# Altium footprint library Raspberry pi.PcbLib: 3 footprints
Each footprint in its own frame and in the unit in brackets; x right, y up, seen from the top. Pads: shape width x height; smd on the part's side, far side on the other; paste and mask are expansions set on the pad; w line width, h text height; cw(c..) or ccw(c..) is an arc to the next point about the centre after c.
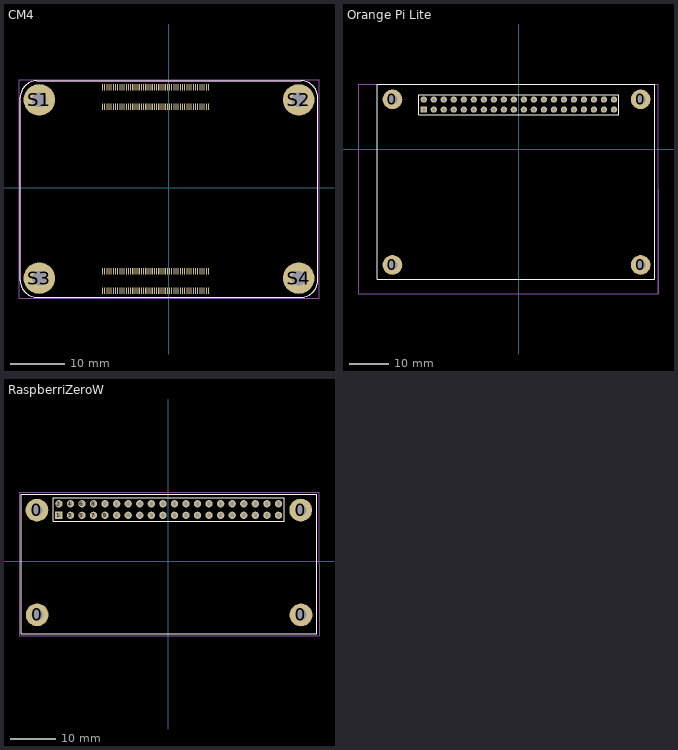
[diagram p0: the footprints below, top view; thin cyan lines are the x and y axes]

## CM4 [mm]
pads (204):
  rect 0.2x1.2 smd: 1(7.325,18.567) 2(7.325,14.986) 3(6.925,18.567) 4(6.925,14.986) 5(6.525,18.567) 6(6.525,14.986) 7(6.125,18.567) 8(6.125,14.986) 9(5.725,18.567) 10(5.725,14.986) 11(5.325,18.567) 12(5.325,14.986) 13(4.925,18.567) 14(4.925,14.986) 15(4.525,18.567) 16(4.525,14.986) 17(4.125,18.567) 18(4.125,14.986) 19(3.725,18.567) 20(3.725,14.986) 21(3.325,18.567) 22(3.325,14.986) 23(2.925,18.567) 24(2.925,14.986) 25(2.525,18.567) 26(2.525,14.986) 27(2.125,18.567) 28(2.125,14.986) 29(1.725,18.567) 30(1.725,14.986) 31(1.325,18.567) 32(1.325,14.986) 33(0.925,18.567) 34(0.925,14.986) 35(0.525,18.567) 36(0.525,14.986) 37(0.125,18.567) 38(0.125,14.986) 39(-0.275,18.567) 40(-0.275,14.986) 41(-0.675,18.567) 42(-0.675,14.986) 43(-1.075,18.567) 44(-1.075,14.986) 45(-1.475,18.567) 46(-1.475,14.986) 47(-1.875,18.567) 48(-1.875,14.986) 49(-2.275,18.567) 50(-2.275,14.986) 51(-2.675,18.567) 52(-2.675,14.986) 53(-3.075,18.567) 54(-3.075,14.986) 55(-3.475,18.567) 56(-3.475,14.986) 57(-3.875,18.567) 58(-3.875,14.986) 59(-4.275,18.567) 60(-4.275,14.986) 61(-4.675,18.567) 62(-4.675,14.986) 63(-5.075,18.567) 64(-5.075,14.986) 65(-5.475,18.567) 66(-5.475,14.986) 67(-5.875,18.567) 68(-5.875,14.986) 69(-6.275,18.567) 70(-6.275,14.986) 71(-6.675,18.567) 72(-6.675,14.986) 73(-7.075,18.567) 74(-7.075,14.986) 75(-7.475,18.567) 76(-7.475,14.986) 77(-7.875,18.567) 78(-7.875,14.986) 79(-8.275,18.567) 80(-8.275,14.986) 81(-8.675,18.567) 82(-8.675,14.986) 83(-9.075,18.567) 84(-9.075,14.986) 85(-9.475,18.567) 86(-9.475,14.986) 87(-9.875,18.567) 88(-9.875,14.986) 89(-10.275,18.567) 90(-10.275,14.986) 91(-10.675,18.567) 92(-10.675,14.986) 93(-11.075,18.567) 94(-11.075,14.986) 95(-11.475,18.567) 96(-11.475,14.986) 97(-11.875,18.567) 98(-11.875,14.986) 99(-12.275,18.567) 100(-12.275,14.986) 101(7.325,-15.443) 102(7.325,-19.025) 103(6.925,-15.443) 104(6.925,-19.025) 105(6.525,-15.443) 106(6.525,-19.025) 107(6.125,-15.443) 108(6.125,-19.025) 109(5.725,-15.443) 110(5.725,-19.025) 111(5.325,-15.443) 112(5.325,-19.025) 113(4.925,-15.443) 114(4.925,-19.025) 115(4.525,-15.443) 116(4.525,-19.025) 117(4.125,-15.443) 118(4.125,-19.025) 119(3.725,-15.443) 120(3.725,-19.025) 121(3.325,-15.443) 122(3.325,-19.025) 123(2.925,-15.443) 124(2.925,-19.025) 125(2.525,-15.443) 126(2.525,-19.025) 127(2.125,-15.443) 128(2.125,-19.025) 129(1.725,-15.443) 130(1.725,-19.025) 131(1.325,-15.443) 132(1.325,-19.025) 133(0.925,-15.443) 134(0.925,-19.025) 135(0.525,-15.443) 136(0.525,-19.025) 137(0.125,-15.443) 138(0.125,-19.025) 139(-0.275,-15.443) 140(-0.275,-19.025) 141(-0.675,-15.443) 142(-0.675,-19.025) 143(-1.075,-15.443) 144(-1.075,-19.025) 145(-1.475,-15.443) 146(-1.475,-19.025) 147(-1.875,-15.443) 148(-1.875,-19.025) 149(-2.275,-15.443) 150(-2.275,-19.025) 151(-2.675,-15.443) 152(-2.675,-19.025) 153(-3.075,-15.443) 154(-3.075,-19.025) 155(-3.475,-15.443) 156(-3.475,-19.025) 157(-3.875,-15.443) 158(-3.875,-19.025) 159(-4.275,-15.443) 160(-4.275,-19.025) 161(-4.675,-15.443) 162(-4.675,-19.025) 163(-5.075,-15.443) 164(-5.075,-19.025) 165(-5.475,-15.443) 166(-5.475,-19.025) 167(-5.875,-15.443) 168(-5.875,-19.025) 169(-6.275,-15.443) 170(-6.275,-19.025) 171(-6.675,-15.443) 172(-6.675,-19.025) 173(-7.075,-15.443) 174(-7.075,-19.025) 175(-7.475,-15.443) 176(-7.475,-19.025) 177(-7.875,-15.443) 178(-7.875,-19.025) 179(-8.275,-15.443) 180(-8.275,-19.025) 181(-8.675,-15.443) 182(-8.675,-19.025) 183(-9.075,-15.443) 184(-9.075,-19.025) 185(-9.475,-15.443) 186(-9.475,-19.025) 187(-9.875,-15.443) 188(-9.875,-19.025) 189(-10.275,-15.443) 190(-10.275,-19.025) 191(-10.675,-15.443) 192(-10.675,-19.025) 193(-11.075,-15.443) 194(-11.075,-19.025) 195(-11.475,-15.443) 196(-11.475,-19.025) 197(-11.875,-15.443) 198(-11.875,-19.025) 199(-12.275,-15.443) 200(-12.275,-19.025)
  round 5.8 hole 2.7: S1(-23.975,16.271) S2(24.025,16.271) S3(-23.975,-16.729) S4(24.025,-16.729)
Top Overlay:
  lines w0.127: -27.475,-17.229 ccw(c-24.475,-17.229) -24.475,-20.229 24.525,-20.229 ccw(c24.525,-17.229) 27.525,-17.229 27.525,16.771 ccw(c24.525,16.771) 24.525,19.771 -24.475,19.771 ccw(c-24.475,16.771) -27.475,16.771 -27.475,-17.229
Mechanical 13:
  lines w0.127: -27.475,-17.229 ccw(c-24.475,-17.229) -24.475,-20.229 24.525,-20.229 ccw(c24.525,-17.229) 27.525,-17.229 27.525,16.771 ccw(c24.525,16.771) 24.525,19.771 -24.475,19.771 ccw(c-24.475,16.771) -27.475,16.771 -27.475,-17.229
Mechanical 15:
  lines w0.05: -27.725,-20.479 -27.725,20.021 27.775,20.021 27.775,-20.479 -27.725,-20.479
3D body "CM4-step.stp": height 5.65, standoff 0.87, extent -27.457,-20.188 27.543,19.812

## Orange Pi Lite [mm]
pads (44):
  round 5 hole 2.5: 0(-32.055,-29.362) 0(-32.055,12.649) 0(30.937,-29.362) 0(30.937,12.649)
  round 1.6 hole 0.9: 1(24.155,12.598) 2(24.155,10.058) 3(21.615,12.598) 4(21.615,10.058) 5(19.075,12.598) 6(19.075,10.058) 7(16.535,12.598) 8(16.535,10.058) 9(13.995,12.598) 10(13.995,10.058) 11(11.455,12.598) 12(11.455,10.058) 13(8.915,12.598) 14(8.915,10.058) 15(6.375,12.598) 16(6.375,10.058) 17(3.835,12.598) 18(3.835,10.058) 19(1.295,12.598) 20(1.295,10.058) 21(-1.245,12.598) 22(-1.245,10.058) 23(-3.785,12.598) 24(-3.785,10.058) 25(-6.325,12.598) 26(-6.325,10.058) 27(-8.865,12.598) 28(-8.865,10.058) 29(-11.405,12.598) 30(-11.405,10.058) 31(-13.945,12.598) 32(-13.945,10.058) 33(-16.485,12.598) 34(-16.485,10.058) 35(-19.025,12.598) 36(-19.025,10.058) 37(-21.565,12.598) 38(-21.565,10.058) 39(-24.105,12.598)
  rect 1.6x1.6 hole 0.9: 40(-24.105,10.058)
Top Overlay:
  lines w0.2: -25.375,8.788 -25.375,13.868 25.425,13.868 25.425,8.788 -25.375,8.788
  lines w0.254: -35.916,-32.944 -35.916,16.459 34.442,16.459 34.442,-32.944 -35.916,-32.944
Mechanical 1:
  lines w0.254: -40.792,-36.652 35.331,-36.652 35.331,16.459 -40.792,16.459 -40.792,-36.652
Mechanical 15:
  lines w0.254: -40.792,-36.652 -40.792,16.459 35.331,16.459 35.331,-36.652 -40.792,-36.652
3D body "orangePi.SLDPRT": height 27, standoff 8, extent -40.253,-36.144 34.747,15.856
3D body "Spacer bolt.SLDPRT": height 12.2, standoff -5.8, extent 28.437,9.762 33.437,15.536
3D body "Spacer bolt.SLDPRT": height 12.2, standoff -5.8, extent -34.555,9.762 -29.555,15.536
3D body "Spacer bolt.SLDPRT": height 12.2, standoff -5.8, extent 28.437,-32.249 33.437,-26.476
3D body "Spacer bolt.SLDPRT": height 12.2, standoff -5.8, extent -34.555,-32.249 -29.555,-26.476
3D body "HDR2.54-1P_M.STEP": height 8.5, standoff -3, extent -25.375,11.328 -22.835,13.868
3D body "HDR2.54-1P_M.STEP": height 8.5, standoff -3, extent -25.375,8.788 -22.835,11.328
3D body "HDR2.54-1P_M.STEP": height 8.5, standoff -3, extent -22.835,11.328 -20.295,13.868
3D body "HDR2.54-1P_M.STEP": height 8.5, standoff -3, extent -22.835,8.788 -20.295,11.328
3D body "HDR2.54-1P_M.STEP": height 8.5, standoff -3, extent -20.295,11.328 -17.755,13.868
3D body "HDR2.54-1P_M.STEP": height 8.5, standoff -3, extent -20.295,8.788 -17.755,11.328
3D body "HDR2.54-1P_M.STEP": height 8.5, standoff -3, extent -17.755,11.328 -15.215,13.868
3D body "HDR2.54-1P_M.STEP": height 8.5, standoff -3, extent -17.755,8.788 -15.215,11.328
3D body "HDR2.54-1P_M.STEP": height 8.5, standoff -3, extent -15.215,11.328 -12.675,13.868
3D body "HDR2.54-1P_M.STEP": height 8.5, standoff -3, extent -15.215,8.788 -12.675,11.328
3D body "HDR2.54-1P_M.STEP": height 8.5, standoff -3, extent -12.675,11.328 -10.135,13.868
3D body "HDR2.54-1P_M.STEP": height 8.5, standoff -3, extent -12.675,8.788 -10.135,11.328
3D body "HDR2.54-1P_M.STEP": height 8.5, standoff -3, extent -10.135,11.328 -7.595,13.868
3D body "HDR2.54-1P_M.STEP": height 8.5, standoff -3, extent -10.135,8.788 -7.595,11.328
3D body "HDR2.54-1P_M.STEP": height 8.5, standoff -3, extent -7.595,11.328 -5.055,13.868
3D body "HDR2.54-1P_M.STEP": height 8.5, standoff -3, extent -7.595,8.788 -5.055,11.328
3D body "HDR2.54-1P_M.STEP": height 8.5, standoff -3, extent -5.055,11.328 -2.515,13.868
3D body "HDR2.54-1P_M.STEP": height 8.5, standoff -3, extent -5.055,8.788 -2.515,11.328
3D body "HDR2.54-1P_M.STEP": height 8.5, standoff -3, extent -2.515,11.328 0.025,13.868
3D body "HDR2.54-1P_M.STEP": height 8.5, standoff -3, extent -2.515,8.788 0.025,11.328
3D body "HDR2.54-1P_M.STEP": height 8.5, standoff -3, extent 0.025,11.328 2.565,13.868
3D body "HDR2.54-1P_M.STEP": height 8.5, standoff -3, extent 0.025,8.788 2.565,11.328
3D body "HDR2.54-1P_M.STEP": height 8.5, standoff -3, extent 2.565,11.328 5.105,13.868
3D body "HDR2.54-1P_M.STEP": height 8.5, standoff -3, extent 2.565,8.788 5.105,11.328
3D body "HDR2.54-1P_M.STEP": height 8.5, standoff -3, extent 5.105,11.328 7.645,13.868
3D body "HDR2.54-1P_M.STEP": height 8.5, standoff -3, extent 5.105,8.788 7.645,11.328
3D body "HDR2.54-1P_M.STEP": height 8.5, standoff -3, extent 7.645,11.328 10.185,13.868
3D body "HDR2.54-1P_M.STEP": height 8.5, standoff -3, extent 7.645,8.788 10.185,11.328
3D body "HDR2.54-1P_M.STEP": height 8.5, standoff -3, extent 10.185,11.328 12.725,13.868
3D body "HDR2.54-1P_M.STEP": height 8.5, standoff -3, extent 10.185,8.788 12.725,11.328
3D body "HDR2.54-1P_M.STEP": height 8.5, standoff -3, extent 12.725,11.328 15.265,13.868
3D body "HDR2.54-1P_M.STEP": height 8.5, standoff -3, extent 12.725,8.788 15.265,11.328
3D body "HDR2.54-1P_M.STEP": height 8.5, standoff -3, extent 15.265,11.328 17.805,13.868
3D body "HDR2.54-1P_M.STEP": height 8.5, standoff -3, extent 15.265,8.788 17.805,11.328
3D body "HDR2.54-1P_M.STEP": height 8.5, standoff -3, extent 17.805,11.328 20.345,13.868
3D body "HDR2.54-1P_M.STEP": height 8.5, standoff -3, extent 17.805,8.788 20.345,11.328
3D body "HDR2.54-1P_M.STEP": height 8.5, standoff -3, extent 20.345,11.328 22.885,13.868
3D body "HDR2.54-1P_M.STEP": height 8.5, standoff -3, extent 20.345,8.788 22.885,11.328
3D body "HDR2.54-1P_M.STEP": height 8.5, standoff -3, extent 22.885,11.328 25.425,13.868
3D body "HDR2.54-1P_M.STEP": height 8.5, standoff -3, extent 22.885,8.788 25.425,11.328

## RaspberriZeroW [mm]
pads (44):
  round 5 hole 2.5: 0(-28.905,11.227) 0(-28.854,-11.76) 0(29.083,11.252) 0(29.134,-11.786)
  rect 1.6x1.6 hole 0.9: 1(-24.079,10.109)
  round 1.6 hole 0.9: 2(-24.079,12.649) 3(-21.539,10.109) 4(-21.539,12.649) 5(-18.999,10.109) 6(-18.999,12.649) 7(-16.459,10.109) 8(-16.459,12.649) 9(-13.919,10.109) 10(-13.919,12.649) 11(-11.379,10.109) 12(-11.379,12.649) 13(-8.839,10.109) 14(-8.839,12.649) 15(-6.299,10.109) 16(-6.299,12.649) 17(-3.759,10.109) 18(-3.759,12.649) 19(-1.219,10.109) 20(-1.219,12.649) 21(1.321,10.109) 22(1.321,12.649) 23(3.861,10.109) 24(3.861,12.649) 25(6.401,10.109) 26(6.401,12.649) 27(8.941,10.109) 28(8.941,12.649) 29(11.481,10.109) 30(11.481,12.649) 31(14.021,10.109) 32(14.021,12.649) 33(16.561,10.109) 34(16.561,12.649) 35(19.101,10.109) 36(19.101,12.649) 37(21.641,10.109) 38(21.641,12.649) 39(24.181,10.109) 40(24.181,12.649)
Top Overlay:
  lines w0.2: -25.349,8.839 -25.349,13.919 25.451,13.919 25.451,8.839 -25.349,8.839
  lines w0.254: 32.588,-15.875 32.588,14.757 -32.385,14.757 -32.385,-15.9 32.614,-15.9
Mechanical 1:
  lines w0.254: 32.588,-15.875 32.614,-15.9 ; -32.842,-16.408 33.096,-16.408 33.096,15.215 -32.842,15.215 -32.842,-16.408
Mechanical 15:
  lines w0.254: -32.842,-16.408 -32.842,15.215 33.096,15.215 33.096,-16.408 -32.842,-16.408
3D body "HDR2.54-1P_M.STEP": height 8.5, standoff -3, extent -25.349,11.379 -22.809,13.919
3D body "HDR2.54-1P_M.STEP": height 8.5, standoff -3, extent -25.349,8.839 -22.809,11.379
3D body "HDR2.54-1P_M.STEP": height 8.5, standoff -3, extent -22.809,11.379 -20.269,13.919
3D body "HDR2.54-1P_M.STEP": height 8.5, standoff -3, extent -22.809,8.839 -20.269,11.379
3D body "HDR2.54-1P_M.STEP": height 8.5, standoff -3, extent -20.269,11.379 -17.729,13.919
3D body "HDR2.54-1P_M.STEP": height 8.5, standoff -3, extent -20.269,8.839 -17.729,11.379
3D body "HDR2.54-1P_M.STEP": height 8.5, standoff -3, extent -17.729,11.379 -15.189,13.919
3D body "HDR2.54-1P_M.STEP": height 8.5, standoff -3, extent -17.729,8.839 -15.189,11.379
3D body "HDR2.54-1P_M.STEP": height 8.5, standoff -3, extent -15.189,11.379 -12.649,13.919
3D body "HDR2.54-1P_M.STEP": height 8.5, standoff -3, extent -15.189,8.839 -12.649,11.379
3D body "HDR2.54-1P_M.STEP": height 8.5, standoff -3, extent -12.649,11.379 -10.109,13.919
3D body "HDR2.54-1P_M.STEP": height 8.5, standoff -3, extent -12.649,8.839 -10.109,11.379
3D body "HDR2.54-1P_M.STEP": height 8.5, standoff -3, extent -10.109,11.379 -7.569,13.919
3D body "HDR2.54-1P_M.STEP": height 8.5, standoff -3, extent -10.109,8.839 -7.569,11.379
3D body "HDR2.54-1P_M.STEP": height 8.5, standoff -3, extent -7.569,11.379 -5.029,13.919
3D body "HDR2.54-1P_M.STEP": height 8.5, standoff -3, extent -7.569,8.839 -5.029,11.379
3D body "HDR2.54-1P_M.STEP": height 8.5, standoff -3, extent -5.029,11.379 -2.489,13.919
3D body "HDR2.54-1P_M.STEP": height 8.5, standoff -3, extent -5.029,8.839 -2.489,11.379
3D body "HDR2.54-1P_M.STEP": height 8.5, standoff -3, extent -2.489,11.379 0.051,13.919
3D body "HDR2.54-1P_M.STEP": height 8.5, standoff -3, extent -2.489,8.839 0.051,11.379
3D body "HDR2.54-1P_M.STEP": height 8.5, standoff -3, extent 0.051,11.379 2.591,13.919
3D body "HDR2.54-1P_M.STEP": height 8.5, standoff -3, extent 0.051,8.839 2.591,11.379
3D body "HDR2.54-1P_M.STEP": height 8.5, standoff -3, extent 2.591,11.379 5.131,13.919
3D body "HDR2.54-1P_M.STEP": height 8.5, standoff -3, extent 2.591,8.839 5.131,11.379
3D body "HDR2.54-1P_M.STEP": height 8.5, standoff -3, extent 5.131,11.379 7.671,13.919
3D body "HDR2.54-1P_M.STEP": height 8.5, standoff -3, extent 5.131,8.839 7.671,11.379
3D body "HDR2.54-1P_M.STEP": height 8.5, standoff -3, extent 7.671,11.379 10.211,13.919
3D body "HDR2.54-1P_M.STEP": height 8.5, standoff -3, extent 7.671,8.839 10.211,11.379
3D body "HDR2.54-1P_M.STEP": height 8.5, standoff -3, extent 10.211,11.379 12.751,13.919
3D body "HDR2.54-1P_M.STEP": height 8.5, standoff -3, extent 10.211,8.839 12.751,11.379
3D body "HDR2.54-1P_M.STEP": height 8.5, standoff -3, extent 12.751,11.379 15.291,13.919
3D body "HDR2.54-1P_M.STEP": height 8.5, standoff -3, extent 12.751,8.839 15.291,11.379
3D body "HDR2.54-1P_M.STEP": height 8.5, standoff -3, extent 15.291,11.379 17.831,13.919
3D body "HDR2.54-1P_M.STEP": height 8.5, standoff -3, extent 15.291,8.839 17.831,11.379
3D body "HDR2.54-1P_M.STEP": height 8.5, standoff -3, extent 17.831,11.379 20.371,13.919
3D body "HDR2.54-1P_M.STEP": height 8.5, standoff -3, extent 17.831,8.839 20.371,11.379
3D body "HDR2.54-1P_M.STEP": height 8.5, standoff -3, extent 20.371,11.379 22.911,13.919
3D body "HDR2.54-1P_M.STEP": height 8.5, standoff -3, extent 20.371,8.839 22.911,11.379
3D body "HDR2.54-1P_M.STEP": height 8.5, standoff -3, extent 22.911,11.379 25.451,13.919
3D body "HDR2.54-1P_M.STEP": height 8.5, standoff -3, extent 22.911,8.839 25.451,11.379
3D body "Spacer bolt.SLDPRT": height 12.2, standoff -5.8, extent 26.583,8.365 31.583,14.139
3D body "Spacer bolt.SLDPRT": height 12.2, standoff -5.8, extent -31.405,8.34 -26.405,14.114
3D body "Spacer bolt.SLDPRT": height 12.2, standoff -5.8, extent 26.634,-14.672 31.634,-8.899
3D body "Spacer bolt.SLDPRT": height 12.2, standoff -5.8, extent -31.354,-14.647 -26.354,-8.873
3D body "Raspberry PI Zero W.step": height 22.48, standoff 11.1, extent -32.385,-15.909 32.615,14.741